# Altium footprint library con-samtec.PCBLIB: 805 footprints (part 51 of 55)
Each footprint in its own frame and in the unit in brackets; x right, y up, seen from the top. Pads: shape width x height; smd on the part's side, far side on the other; paste and mask are expansions set on the pad; w line width, h text height; cw(c..) or ccw(c..) is an arc to the next point about the centre after c.
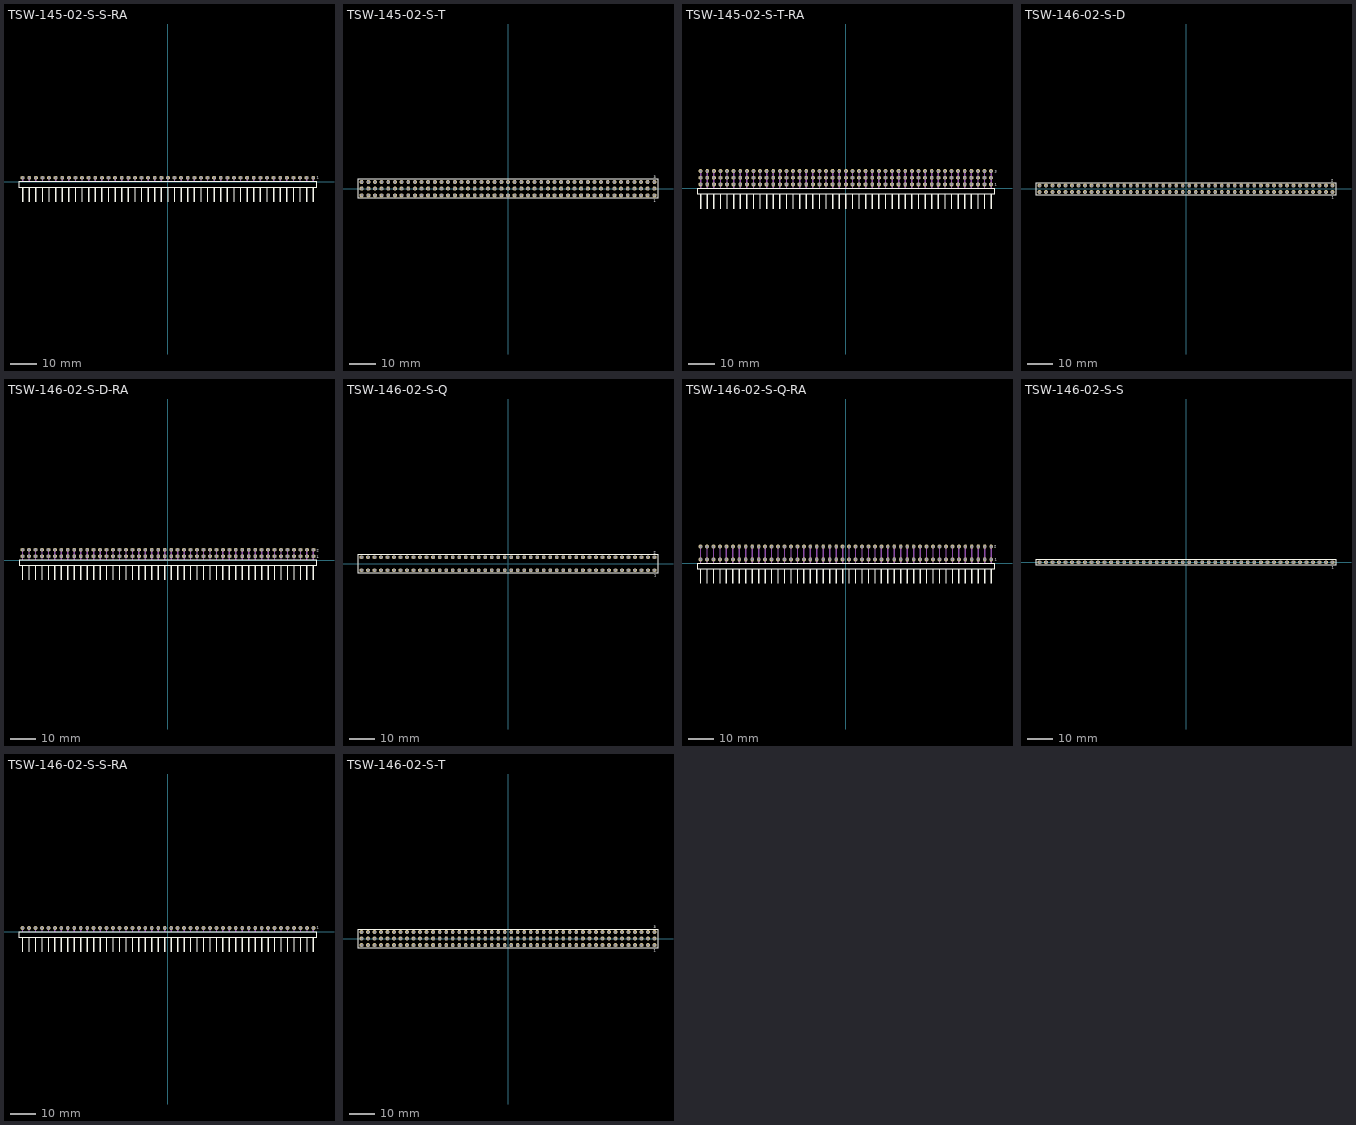
[diagram p50: the footprints below, top view; thin cyan lines are the x and y axes]

## TSW-145-02-S-S-RA [mil]
pads (45):
  oct 59.06x59.06 hole 39.37: 1(2200,60) 2(2100,60) 3(2000,60) 4(1900,60) 5(1800,60) 6(1700,60) 7(1600,60) 8(1500,60) 9(1400,60) 10(1300,60) 11(1200,60) 12(1100,60) 13(1000,60) 14(900,60) 15(800,60) 16(700,60) 17(600,60) 18(500,60) 19(400,60) 20(300,60) 21(200,60) 22(100,60) 23(0,60) 24(-100,60) 25(-200,60) 26(-300,60) 27(-400,60) 28(-500,60) 29(-600,60) 30(-700,60) 31(-800,60) 32(-900,60) 33(-1000,60) 34(-1100,60) 35(-1200,60) 36(-1300,60) 37(-1400,60) 38(-1500,60) 39(-1600,60) 40(-1700,60) 41(-1800,60) 42(-1900,60) 43(-2000,60) 44(-2100,60) 45(-2200,60)
Top Overlay:
  rectangle: -2210,-310.63 -2190,-80.32
  rectangle: -2110,-310.63 -2090,-80.32
  rectangle: -2010,-310.63 -1990,-80.32
  rectangle: -1910,-310.63 -1890,-80.32
  rectangle: -1810,-310.63 -1790,-80.32
  rectangle: -1710,-310.63 -1690,-80.32
  rectangle: -1610,-310.63 -1590,-80.32
  rectangle: -1510,-310.63 -1490,-80.32
  rectangle: -1410,-310.63 -1390,-80.32
  rectangle: -1310,-310.63 -1290,-80.32
  rectangle: -1210,-310.63 -1190,-80.32
  rectangle: -1110,-310.63 -1090,-80.32
  rectangle: -1010,-310.63 -990,-80.32
  rectangle: -910,-310.63 -890,-80.32
  rectangle: -810,-310.63 -790,-80.32
  rectangle: -710,-310.63 -690,-80.32
  rectangle: -610,-310.63 -590,-80.32
  rectangle: -510,-310.63 -490,-80.32
  rectangle: -410,-310.63 -390,-80.32
  rectangle: -310,-310.63 -290,-80.32
  rectangle: -210,-310.63 -190,-80.32
  rectangle: -110,-310.63 -90,-80.32
  rectangle: -10,-310.63 10,-80.32
  rectangle: 90,-310.63 110,-80.32
  rectangle: 190,-310.63 210,-80.32
  rectangle: 290,-310.63 310,-80.32
  rectangle: 390,-310.63 410,-80.32
  rectangle: 490,-310.63 510,-80.32
  rectangle: 590,-310.63 610,-80.32
  rectangle: 690,-310.63 710,-80.32
  rectangle: 790,-310.63 810,-80.32
  rectangle: 890,-310.63 910,-80.32
  rectangle: 990,-310.63 1010,-80.32
  rectangle: 1090,-310.63 1110,-80.32
  rectangle: 1190,-310.63 1210,-80.32
  rectangle: 1290,-310.63 1310,-80.32
  rectangle: 1390,-310.63 1410,-80.32
  rectangle: 1490,-310.63 1510,-80.32
  rectangle: 1590,-310.63 1610,-80.32
  rectangle: 1690,-310.63 1710,-80.32
  rectangle: 1790,-310.63 1810,-80.32
  rectangle: 1890,-310.63 1910,-80.32
  rectangle: 1990,-310.63 2010,-80.32
  rectangle: 2090,-310.63 2110,-80.32
  rectangle: 2190,-310.63 2210,-80.32
  lines w8: -2255.08,-80.55 2255.08,-80.55 2255.08,-4.17 -2255.08,-4.17 -2255.08,-80.55
  text "1" at 2250.47,45.35 h36.81
Mechanical 16:
  rectangle: -2210,0 -2190,70
  rectangle: -2110,0 -2090,70
  rectangle: -2010,0 -1990,70
  rectangle: -1910,0 -1890,70
  rectangle: -1810,0 -1790,70
  rectangle: -1710,0 -1690,70
  rectangle: -1610,0 -1590,70
  rectangle: -1510,0 -1490,70
  rectangle: -1410,0 -1390,70
  rectangle: -1310,0 -1290,70
  rectangle: -1210,0 -1190,70
  rectangle: -1110,0 -1090,70
  rectangle: -1010,0 -990,70
  rectangle: -910,0 -890,70
  rectangle: -810,0 -790,70
  rectangle: -710,0 -690,70
  rectangle: -610,0 -590,70
  rectangle: -510,0 -490,70
  rectangle: -410,0 -390,70
  rectangle: -310,0 -290,70
  rectangle: -210,0 -190,70
  rectangle: -110,0 -90,70
  rectangle: -10,0 10,70
  rectangle: 90,0 110,70
  rectangle: 190,0 210,70
  rectangle: 290,0 310,70
  rectangle: 390,0 410,70
  rectangle: 490,0 510,70
  rectangle: 590,0 610,70
  rectangle: 690,0 710,70
  rectangle: 790,0 810,70
  rectangle: 890,0 910,70
  rectangle: 990,0 1010,70
  rectangle: 1090,0 1110,70
  rectangle: 1190,0 1210,70
  rectangle: 1290,0 1310,70
  rectangle: 1390,0 1410,70
  rectangle: 1490,0 1510,70
  rectangle: 1590,0 1610,70
  rectangle: 1690,0 1710,70
  rectangle: 1790,0 1810,70
  rectangle: 1890,0 1910,70
  rectangle: 1990,0 2010,70
  rectangle: 2090,0 2110,70
  rectangle: 2190,0 2210,70

## TSW-145-02-S-T [mm]
pads (135):
  oct 1.5x1.5 hole 1: 1(55.88,-2.54) 2(55.88,0) 3(55.88,2.54) 4(53.34,-2.54) 5(53.34,0) 6(53.34,2.54) 7(50.8,-2.54) 8(50.8,0) 9(50.8,2.54) 10(48.26,-2.54) 11(48.26,0) 12(48.26,2.54) 13(45.72,-2.54) 14(45.72,0) 15(45.72,2.54) 16(43.18,-2.54) 17(43.18,0) 18(43.18,2.54) 19(40.64,-2.54) 20(40.64,0) 21(40.64,2.54) 22(38.1,-2.54) 23(38.1,0) 24(38.1,2.54) 25(35.56,-2.54) 26(35.56,0) 27(35.56,2.54) 28(33.02,-2.54) 29(33.02,0) 30(33.02,2.54) 31(30.48,-2.54) 32(30.48,0) 33(30.48,2.54) 34(27.94,-2.54) 35(27.94,0) 36(27.94,2.54) 37(25.4,-2.54) 38(25.4,0) 39(25.4,2.54) 40(22.86,-2.54) 41(22.86,0) 42(22.86,2.54) 43(20.32,-2.54) 44(20.32,0) 45(20.32,2.54) 46(17.78,-2.54) 47(17.78,0) 48(17.78,2.54) 49(15.24,-2.54) 50(15.24,0) 51(15.24,2.54) 52(12.7,-2.54) 53(12.7,0) 54(12.7,2.54) 55(10.16,-2.54) 56(10.16,0) 57(10.16,2.54) 58(7.62,-2.54) 59(7.62,0) 60(7.62,2.54) 61(5.08,-2.54) 62(5.08,0) 63(5.08,2.54) 64(2.54,-2.54) 65(2.54,0) 66(2.54,2.54) 67(0,-2.54) 68(0,0) 69(0,2.54) 70(-2.54,-2.54) 71(-2.54,0) 72(-2.54,2.54) 73(-5.08,-2.54) 74(-5.08,0) 75(-5.08,2.54) 76(-7.62,-2.54) 77(-7.62,0) 78(-7.62,2.54) 79(-10.16,-2.54) 80(-10.16,0) 81(-10.16,2.54) 82(-12.7,-2.54) 83(-12.7,0) 84(-12.7,2.54) 85(-15.24,-2.54) 86(-15.24,0) 87(-15.24,2.54) 88(-17.78,-2.54) 89(-17.78,0) 90(-17.78,2.54) 91(-20.32,-2.54) 92(-20.32,0) 93(-20.32,2.54) 94(-22.86,-2.54) 95(-22.86,0) 96(-22.86,2.54) 97(-25.4,-2.54) 98(-25.4,0) 99(-25.4,2.54) 100(-27.94,-2.54) 101(-27.94,0) 102(-27.94,2.54) 103(-30.48,-2.54) 104(-30.48,0) 105(-30.48,2.54) 106(-33.02,-2.54) 107(-33.02,0) 108(-33.02,2.54) 109(-35.56,-2.54) 110(-35.56,0) 111(-35.56,2.54) 112(-38.1,-2.54) 113(-38.1,0) 114(-38.1,2.54) 115(-40.64,-2.54) 116(-40.64,0) 117(-40.64,2.54) 118(-43.18,-2.54) 119(-43.18,0) 120(-43.18,2.54) 121(-45.72,-2.54) 122(-45.72,0) 123(-45.72,2.54) 124(-48.26,-2.54) 125(-48.26,0) 126(-48.26,2.54) 127(-50.8,-2.54) 128(-50.8,0) 129(-50.8,2.54) 130(-53.34,-2.54) 131(-53.34,0) 132(-53.34,2.54) 133(-55.88,-2.54) 134(-55.88,0) 135(-55.88,2.54)
Top Overlay:
  lines w0.203: -57.279,-3.695 57.279,-3.695 57.279,3.695 -57.279,3.695 -57.279,-3.695
  text "1" at 55.572,-5.188 h0.94
  text "3" at 55.568,3.989 h0.94
Mechanical 16:
  rectangle: -56.23,-2.89 -55.53,-2.19
  rectangle: -56.23,-0.35 -55.53,0.35
  rectangle: -56.23,2.19 -55.53,2.89
  rectangle: -53.69,-2.89 -52.99,-2.19
  rectangle: -53.69,-0.35 -52.99,0.35
  rectangle: -53.69,2.19 -52.99,2.89
  rectangle: -51.15,-2.89 -50.45,-2.19
  rectangle: -51.15,-0.35 -50.45,0.35
  rectangle: -51.15,2.19 -50.45,2.89
  rectangle: -48.61,-2.89 -47.91,-2.19
  rectangle: -48.61,-0.35 -47.91,0.35
  rectangle: -48.61,2.19 -47.91,2.89
  rectangle: -46.07,-2.89 -45.37,-2.19
  rectangle: -46.07,-0.35 -45.37,0.35
  rectangle: -46.07,2.19 -45.37,2.89
  rectangle: -43.53,-2.89 -42.83,-2.19
  rectangle: -43.53,-0.35 -42.83,0.35
  rectangle: -43.53,2.19 -42.83,2.89
  rectangle: -40.99,-2.89 -40.29,-2.19
  rectangle: -40.99,-0.35 -40.29,0.35
  rectangle: -40.99,2.19 -40.29,2.89
  rectangle: -38.45,-2.89 -37.75,-2.19
  rectangle: -38.45,-0.35 -37.75,0.35
  rectangle: -38.45,2.19 -37.75,2.89
  rectangle: -35.91,-2.89 -35.21,-2.19
  rectangle: -35.91,-0.35 -35.21,0.35
  rectangle: -35.91,2.19 -35.21,2.89
  rectangle: -33.37,-2.89 -32.67,-2.19
  rectangle: -33.37,-0.35 -32.67,0.35
  rectangle: -33.37,2.19 -32.67,2.89
  rectangle: -30.83,-2.89 -30.13,-2.19
  rectangle: -30.83,-0.35 -30.13,0.35
  rectangle: -30.83,2.19 -30.13,2.89
  rectangle: -28.29,-2.89 -27.59,-2.19
  rectangle: -28.29,-0.35 -27.59,0.35
  rectangle: -28.29,2.19 -27.59,2.89
  rectangle: -25.75,-2.89 -25.05,-2.19
  rectangle: -25.75,-0.35 -25.05,0.35
  rectangle: -25.75,2.19 -25.05,2.89
  rectangle: -23.21,-2.89 -22.51,-2.19
  rectangle: -23.21,-0.35 -22.51,0.35
  rectangle: -23.21,2.19 -22.51,2.89
  rectangle: -20.67,-2.89 -19.97,-2.19
  rectangle: -20.67,-0.35 -19.97,0.35
  rectangle: -20.67,2.19 -19.97,2.89
  rectangle: -18.13,-2.89 -17.43,-2.19
  rectangle: -18.13,-0.35 -17.43,0.35
  rectangle: -18.13,2.19 -17.43,2.89
  rectangle: -15.59,-2.89 -14.89,-2.19
  rectangle: -15.59,-0.35 -14.89,0.35
  rectangle: -15.59,2.19 -14.89,2.89
  rectangle: -13.05,-2.89 -12.35,-2.19
  rectangle: -13.05,-0.35 -12.35,0.35
  rectangle: -13.05,2.19 -12.35,2.89
  rectangle: -10.51,-2.89 -9.81,-2.19
  rectangle: -10.51,-0.35 -9.81,0.35
  rectangle: -10.51,2.19 -9.81,2.89
  rectangle: -7.97,-2.89 -7.27,-2.19
  rectangle: -7.97,-0.35 -7.27,0.35
  rectangle: -7.97,2.19 -7.27,2.89
  rectangle: -5.43,-2.89 -4.73,-2.19
  rectangle: -5.43,-0.35 -4.73,0.35
  rectangle: -5.43,2.19 -4.73,2.89
  rectangle: -2.89,-2.89 -2.19,-2.19
  rectangle: -2.89,-0.35 -2.19,0.35
  rectangle: -2.89,2.19 -2.19,2.89
  rectangle: -0.35,-2.89 0.35,-2.19
  rectangle: -0.35,-0.35 0.35,0.35
  rectangle: -0.35,2.19 0.35,2.89
  rectangle: 2.19,-2.89 2.89,-2.19
  rectangle: 2.19,-0.35 2.89,0.35
  rectangle: 2.19,2.19 2.89,2.89
  rectangle: 4.73,-2.89 5.43,-2.19
  rectangle: 4.73,-0.35 5.43,0.35
  rectangle: 4.73,2.19 5.43,2.89
  rectangle: 7.27,-2.89 7.97,-2.19
  rectangle: 7.27,-0.35 7.97,0.35
  rectangle: 7.27,2.19 7.97,2.89
  rectangle: 9.81,-2.89 10.51,-2.19
  rectangle: 9.81,-0.35 10.51,0.35
  rectangle: 9.81,2.19 10.51,2.89
  rectangle: 12.35,-2.89 13.05,-2.19
  rectangle: 12.35,-0.35 13.05,0.35
  rectangle: 12.35,2.19 13.05,2.89
  rectangle: 14.89,-2.89 15.59,-2.19
  rectangle: 14.89,-0.35 15.59,0.35
  rectangle: 14.89,2.19 15.59,2.89
  rectangle: 17.43,-2.89 18.13,-2.19
  rectangle: 17.43,-0.35 18.13,0.35
  rectangle: 17.43,2.19 18.13,2.89
  rectangle: 19.97,-2.89 20.67,-2.19
  rectangle: 19.97,-0.35 20.67,0.35
  rectangle: 19.97,2.19 20.67,2.89
  rectangle: 22.51,-2.89 23.21,-2.19
  rectangle: 22.51,-0.35 23.21,0.35
  rectangle: 22.51,2.19 23.21,2.89
  rectangle: 25.05,-2.89 25.75,-2.19
  rectangle: 25.05,-0.35 25.75,0.35
  rectangle: 25.05,2.19 25.75,2.89
  rectangle: 27.59,-2.89 28.29,-2.19
  rectangle: 27.59,-0.35 28.29,0.35
  rectangle: 27.59,2.19 28.29,2.89
  rectangle: 30.13,-2.89 30.83,-2.19
  rectangle: 30.13,-0.35 30.83,0.35
  rectangle: 30.13,2.19 30.83,2.89
  rectangle: 32.67,-2.89 33.37,-2.19
  rectangle: 32.67,-0.35 33.37,0.35
  rectangle: 32.67,2.19 33.37,2.89
  rectangle: 35.21,-2.89 35.91,-2.19
  rectangle: 35.21,-0.35 35.91,0.35
  rectangle: 35.21,2.19 35.91,2.89
  rectangle: 37.75,-2.89 38.45,-2.19
  rectangle: 37.75,-0.35 38.45,0.35
  rectangle: 37.75,2.19 38.45,2.89
  rectangle: 40.29,-2.89 40.99,-2.19
  rectangle: 40.29,-0.35 40.99,0.35
  rectangle: 40.29,2.19 40.99,2.89
  rectangle: 42.83,-2.89 43.53,-2.19
  rectangle: 42.83,-0.35 43.53,0.35
  rectangle: 42.83,2.19 43.53,2.89
  rectangle: 45.37,-2.89 46.07,-2.19
  rectangle: 45.37,-0.35 46.07,0.35
  rectangle: 45.37,2.19 46.07,2.89
  rectangle: 47.91,-2.89 48.61,-2.19
  rectangle: 47.91,-0.35 48.61,0.35
  rectangle: 47.91,2.19 48.61,2.89
  rectangle: 50.45,-2.89 51.15,-2.19
  rectangle: 50.45,-0.35 51.15,0.35
  rectangle: 50.45,2.19 51.15,2.89
  rectangle: 52.99,-2.89 53.69,-2.19
  rectangle: 52.99,-0.35 53.69,0.35
  rectangle: 52.99,2.19 53.69,2.89
  rectangle: 55.53,-2.89 56.23,-2.19
  rectangle: 55.53,-0.35 56.23,0.35
  rectangle: 55.53,2.19 56.23,2.89

## TSW-145-02-S-T-RA [mil]
pads (135):
  oct 59.06x59.06 hole 39.37: 1(2200,60) 2(2200,160) 3(2200,260) 4(2100,60) 5(2100,160) 6(2100,260) 7(2000,60) 8(2000,160) 9(2000,260) 10(1900,60) 11(1900,160) 12(1900,260) 13(1800,60) 14(1800,160) 15(1800,260) 16(1700,60) 17(1700,160) 18(1700,260) 19(1600,60) 20(1600,160) 21(1600,260) 22(1500,60) 23(1500,160) 24(1500,260) 25(1400,60) 26(1400,160) 27(1400,260) 28(1300,60) 29(1300,160) 30(1300,260) 31(1200,60) 32(1200,160) 33(1200,260) 34(1100,60) 35(1100,160) 36(1100,260) 37(1000,60) 38(1000,160) 39(1000,260) 40(900,60) 41(900,160) 42(900,260) 43(800,60) 44(800,160) 45(800,260) 46(700,60) 47(700,160) 48(700,260) 49(600,60) 50(600,160) 51(600,260) 52(500,60) 53(500,160) 54(500,260) 55(400,60) 56(400,160) 57(400,260) 58(300,60) 59(300,160) 60(300,260) 61(200,60) 62(200,160) 63(200,260) 64(100,60) 65(100,160) 66(100,260) 67(0,60) 68(0,160) 69(0,260) 70(-100,60) 71(-100,160) 72(-100,260) 73(-200,60) 74(-200,160) 75(-200,260) 76(-300,60) 77(-300,160) 78(-300,260) 79(-400,60) 80(-400,160) 81(-400,260) 82(-500,60) 83(-500,160) 84(-500,260) 85(-600,60) 86(-600,160) 87(-600,260) 88(-700,60) 89(-700,160) 90(-700,260) 91(-800,60) 92(-800,160) 93(-800,260) 94(-900,60) 95(-900,160) 96(-900,260) 97(-1000,60) 98(-1000,160) 99(-1000,260) 100(-1100,60) 101(-1100,160) 102(-1100,260) 103(-1200,60) 104(-1200,160) 105(-1200,260) 106(-1300,60) 107(-1300,160) 108(-1300,260) 109(-1400,60) 110(-1400,160) 111(-1400,260) 112(-1500,60) 113(-1500,160) 114(-1500,260) 115(-1600,60) 116(-1600,160) 117(-1600,260) 118(-1700,60) 119(-1700,160) 120(-1700,260) 121(-1800,60) 122(-1800,160) 123(-1800,260) 124(-1900,60) 125(-1900,160) 126(-1900,260) 127(-2000,60) 128(-2000,160) 129(-2000,260) 130(-2100,60) 131(-2100,160) 132(-2100,260) 133(-2200,60) 134(-2200,160) 135(-2200,260)
Top Overlay:
  rectangle: -2210,-310.63 -2190,-80.32
  rectangle: -2110,-310.63 -2090,-80.32
  rectangle: -2010,-310.63 -1990,-80.32
  rectangle: -1910,-310.63 -1890,-80.32
  rectangle: -1810,-310.63 -1790,-80.32
  rectangle: -1710,-310.63 -1690,-80.32
  rectangle: -1610,-310.63 -1590,-80.32
  rectangle: -1510,-310.63 -1490,-80.32
  rectangle: -1410,-310.63 -1390,-80.32
  rectangle: -1310,-310.63 -1290,-80.32
  rectangle: -1210,-310.63 -1190,-80.32
  rectangle: -1110,-310.63 -1090,-80.32
  rectangle: -1010,-310.63 -990,-80.32
  rectangle: -910,-310.63 -890,-80.32
  rectangle: -810,-310.63 -790,-80.32
  rectangle: -710,-310.63 -690,-80.32
  rectangle: -610,-310.63 -590,-80.32
  rectangle: -510,-310.63 -490,-80.32
  rectangle: -410,-310.63 -390,-80.32
  rectangle: -310,-310.63 -290,-80.32
  rectangle: -210,-310.63 -190,-80.32
  rectangle: -110,-310.63 -90,-80.32
  rectangle: -10,-310.63 10,-80.32
  rectangle: 90,-310.63 110,-80.32
  rectangle: 190,-310.63 210,-80.32
  rectangle: 290,-310.63 310,-80.32
  rectangle: 390,-310.63 410,-80.32
  rectangle: 490,-310.63 510,-80.32
  rectangle: 590,-310.63 610,-80.32
  rectangle: 690,-310.63 710,-80.32
  rectangle: 790,-310.63 810,-80.32
  rectangle: 890,-310.63 910,-80.32
  rectangle: 990,-310.63 1010,-80.32
  rectangle: 1090,-310.63 1110,-80.32
  rectangle: 1190,-310.63 1210,-80.32
  rectangle: 1290,-310.63 1310,-80.32
  rectangle: 1390,-310.63 1410,-80.32
  rectangle: 1490,-310.63 1510,-80.32
  rectangle: 1590,-310.63 1610,-80.32
  rectangle: 1690,-310.63 1710,-80.32
  rectangle: 1790,-310.63 1810,-80.32
  rectangle: 1890,-310.63 1910,-80.32
  rectangle: 1990,-310.63 2010,-80.32
  rectangle: 2090,-310.63 2110,-80.32
  rectangle: 2190,-310.63 2210,-80.32
  lines w8: -2255.08,-80.55 2255.08,-80.55 2255.08,-4.17 -2255.08,-4.17 -2255.08,-80.55
  text "1" at 2251.57,41.34 h36.81
  text "3" at 2252.17,236.81 h36.81
Mechanical 16:
  rectangle: -2210,0 -2190,270
  rectangle: -2110,0 -2090,270
  rectangle: -2010,0 -1990,270
  rectangle: -1910,0 -1890,270
  rectangle: -1810,0 -1790,270
  rectangle: -1710,0 -1690,270
  rectangle: -1610,0 -1590,270
  rectangle: -1510,0 -1490,270
  rectangle: -1410,0 -1390,270
  rectangle: -1310,0 -1290,270
  rectangle: -1210,0 -1190,270
  rectangle: -1110,0 -1090,270
  rectangle: -1010,0 -990,270
  rectangle: -910,0 -890,270
  rectangle: -810,0 -790,270
  rectangle: -710,0 -690,270
  rectangle: -610,0 -590,270
  rectangle: -510,0 -490,270
  rectangle: -410,0 -390,270
  rectangle: -310,0 -290,270
  rectangle: -210,0 -190,270
  rectangle: -110,0 -90,270
  rectangle: -10,0 10,270
  rectangle: 90,0 110,270
  rectangle: 190,0 210,270
  rectangle: 290,0 310,270
  rectangle: 390,0 410,270
  rectangle: 490,0 510,270
  rectangle: 590,0 610,270
  rectangle: 690,0 710,270
  rectangle: 790,0 810,270
  rectangle: 890,0 910,270
  rectangle: 990,0 1010,270
  rectangle: 1090,0 1110,270
  rectangle: 1190,0 1210,270
  rectangle: 1290,0 1310,270
  rectangle: 1390,0 1410,270
  rectangle: 1490,0 1510,270
  rectangle: 1590,0 1610,270
  rectangle: 1690,0 1710,270
  rectangle: 1790,0 1810,270
  rectangle: 1890,0 1910,270
  rectangle: 1990,0 2010,270
  rectangle: 2090,0 2110,270
  rectangle: 2190,0 2210,270

## TSW-146-02-S-D [mm]
pads (92):
  oct 1.5x1.5 hole 1: 1(57.15,-1.27) 2(57.15,1.27) 3(54.61,-1.27) 4(54.61,1.27) 5(52.07,-1.27) 6(52.07,1.27) 7(49.53,-1.27) 8(49.53,1.27) 9(46.99,-1.27) 10(46.99,1.27) 11(44.45,-1.27) 12(44.45,1.27) 13(41.91,-1.27) 14(41.91,1.27) 15(39.37,-1.27) 16(39.37,1.27) 17(36.83,-1.27) 18(36.83,1.27) 19(34.29,-1.27) 20(34.29,1.27) 21(31.75,-1.27) 22(31.75,1.27) 23(29.21,-1.27) 24(29.21,1.27) 25(26.67,-1.27) 26(26.67,1.27) 27(24.13,-1.27) 28(24.13,1.27) 29(21.59,-1.27) 30(21.59,1.27) 31(19.05,-1.27) 32(19.05,1.27) 33(16.51,-1.27) 34(16.51,1.27) 35(13.97,-1.27) 36(13.97,1.27) 37(11.43,-1.27) 38(11.43,1.27) 39(8.89,-1.27) 40(8.89,1.27) 41(6.35,-1.27) 42(6.35,1.27) 43(3.81,-1.27) 44(3.81,1.27) 45(1.27,-1.27) 46(1.27,1.27) 47(-1.27,-1.27) 48(-1.27,1.27) 49(-3.81,-1.27) 50(-3.81,1.27) 51(-6.35,-1.27) 52(-6.35,1.27) 53(-8.89,-1.27) 54(-8.89,1.27) 55(-11.43,-1.27) 56(-11.43,1.27) 57(-13.97,-1.27) 58(-13.97,1.27) 59(-16.51,-1.27) 60(-16.51,1.27) 61(-19.05,-1.27) 62(-19.05,1.27) 63(-21.59,-1.27) 64(-21.59,1.27) 65(-24.13,-1.27) 66(-24.13,1.27) 67(-26.67,-1.27) 68(-26.67,1.27) 69(-29.21,-1.27) 70(-29.21,1.27) 71(-31.75,-1.27) 72(-31.75,1.27) 73(-34.29,-1.27) 74(-34.29,1.27) 75(-36.83,-1.27) 76(-36.83,1.27) 77(-39.37,-1.27) 78(-39.37,1.27) 79(-41.91,-1.27) 80(-41.91,1.27) 81(-44.45,-1.27) 82(-44.45,1.27) 83(-46.99,-1.27) 84(-46.99,1.27) 85(-49.53,-1.27) 86(-49.53,1.27) 87(-52.07,-1.27) 88(-52.07,1.27) 89(-54.61,-1.27) 90(-54.61,1.27) 91(-57.15,-1.27) 92(-57.15,1.27)
Top Overlay:
  lines w0.203: -58.549,-2.425 58.549,-2.425 58.549,2.425 -58.549,2.425 -58.549,-2.425
  text "1" at 56.942,-3.818 h0.94
  text "2" at 56.767,2.744 h0.94
Mechanical 16:
  rectangle: -57.5,-1.62 -56.8,-0.92
  rectangle: -57.5,0.92 -56.8,1.62
  rectangle: -54.96,-1.62 -54.26,-0.92
  rectangle: -54.96,0.92 -54.26,1.62
  rectangle: -52.42,-1.62 -51.72,-0.92
  rectangle: -52.42,0.92 -51.72,1.62
  rectangle: -49.88,-1.62 -49.18,-0.92
  rectangle: -49.88,0.92 -49.18,1.62
  rectangle: -47.34,-1.62 -46.64,-0.92
  rectangle: -47.34,0.92 -46.64,1.62
  rectangle: -44.8,-1.62 -44.1,-0.92
  rectangle: -44.8,0.92 -44.1,1.62
  rectangle: -42.26,-1.62 -41.56,-0.92
  rectangle: -42.26,0.92 -41.56,1.62
  rectangle: -39.72,-1.62 -39.02,-0.92
  rectangle: -39.72,0.92 -39.02,1.62
  rectangle: -37.18,-1.62 -36.48,-0.92
  rectangle: -37.18,0.92 -36.48,1.62
  rectangle: -34.64,-1.62 -33.94,-0.92
  rectangle: -34.64,0.92 -33.94,1.62
  rectangle: -32.1,-1.62 -31.4,-0.92
  rectangle: -32.1,0.92 -31.4,1.62
  rectangle: -29.56,-1.62 -28.86,-0.92
  rectangle: -29.56,0.92 -28.86,1.62
  rectangle: -27.02,-1.62 -26.32,-0.92
  rectangle: -27.02,0.92 -26.32,1.62
  rectangle: -24.48,-1.62 -23.78,-0.92
  rectangle: -24.48,0.92 -23.78,1.62
  rectangle: -21.94,-1.62 -21.24,-0.92
  rectangle: -21.94,0.92 -21.24,1.62
  rectangle: -19.4,-1.62 -18.7,-0.92
  rectangle: -19.4,0.92 -18.7,1.62
  rectangle: -16.86,-1.62 -16.16,-0.92
  rectangle: -16.86,0.92 -16.16,1.62
  rectangle: -14.32,-1.62 -13.62,-0.92
  rectangle: -14.32,0.92 -13.62,1.62
  rectangle: -11.78,-1.62 -11.08,-0.92
  rectangle: -11.78,0.92 -11.08,1.62
  rectangle: -9.24,-1.62 -8.54,-0.92
  rectangle: -9.24,0.92 -8.54,1.62
  rectangle: -6.7,-1.62 -6,-0.92
  rectangle: -6.7,0.92 -6,1.62
  rectangle: -4.16,-1.62 -3.46,-0.92
  rectangle: -4.16,0.92 -3.46,1.62
  rectangle: -1.62,-1.62 -0.92,-0.92
  rectangle: -1.62,0.92 -0.92,1.62
  rectangle: 0.92,-1.62 1.62,-0.92
  rectangle: 0.92,0.92 1.62,1.62
  rectangle: 3.46,-1.62 4.16,-0.92
  rectangle: 3.46,0.92 4.16,1.62
  rectangle: 6,-1.62 6.7,-0.92
  rectangle: 6,0.92 6.7,1.62
  rectangle: 8.54,-1.62 9.24,-0.92
  rectangle: 8.54,0.92 9.24,1.62
  rectangle: 11.08,-1.62 11.78,-0.92
  rectangle: 11.08,0.92 11.78,1.62
  rectangle: 13.62,-1.62 14.32,-0.92
  rectangle: 13.62,0.92 14.32,1.62
  rectangle: 16.16,-1.62 16.86,-0.92
  rectangle: 16.16,0.92 16.86,1.62
  rectangle: 18.7,-1.62 19.4,-0.92
  rectangle: 18.7,0.92 19.4,1.62
  rectangle: 21.24,-1.62 21.94,-0.92
  rectangle: 21.24,0.92 21.94,1.62
  rectangle: 23.78,-1.62 24.48,-0.92
  rectangle: 23.78,0.92 24.48,1.62
  rectangle: 26.32,-1.62 27.02,-0.92
  rectangle: 26.32,0.92 27.02,1.62
  rectangle: 28.86,-1.62 29.56,-0.92
  rectangle: 28.86,0.92 29.56,1.62
  rectangle: 31.4,-1.62 32.1,-0.92
  rectangle: 31.4,0.92 32.1,1.62
  rectangle: 33.94,-1.62 34.64,-0.92
  rectangle: 33.94,0.92 34.64,1.62
  rectangle: 36.48,-1.62 37.18,-0.92
  rectangle: 36.48,0.92 37.18,1.62
  rectangle: 39.02,-1.62 39.72,-0.92
  rectangle: 39.02,0.92 39.72,1.62
  rectangle: 41.56,-1.62 42.26,-0.92
  rectangle: 41.56,0.92 42.26,1.62
  rectangle: 44.1,-1.62 44.8,-0.92
  rectangle: 44.1,0.92 44.8,1.62
  rectangle: 46.64,-1.62 47.34,-0.92
  rectangle: 46.64,0.92 47.34,1.62
  rectangle: 49.18,-1.62 49.88,-0.92
  rectangle: 49.18,0.92 49.88,1.62
  rectangle: 51.72,-1.62 52.42,-0.92
  rectangle: 51.72,0.92 52.42,1.62
  rectangle: 54.26,-1.62 54.96,-0.92
  rectangle: 54.26,0.92 54.96,1.62
  rectangle: 56.8,-1.62 57.5,-0.92
  rectangle: 56.8,0.92 57.5,1.62
